# Altium footprint library MyPcbLib.PcbLib: 657 footprints (part 42 of 42)
Each footprint in its own frame and in the unit in brackets; x right, y up, seen from the top. Pads: shape width x height; smd on the part's side, far side on the other; paste and mask are expansions set on the pad; w line width, h text height; cw(c..) or ccw(c..) is an arc to the next point about the centre after c.
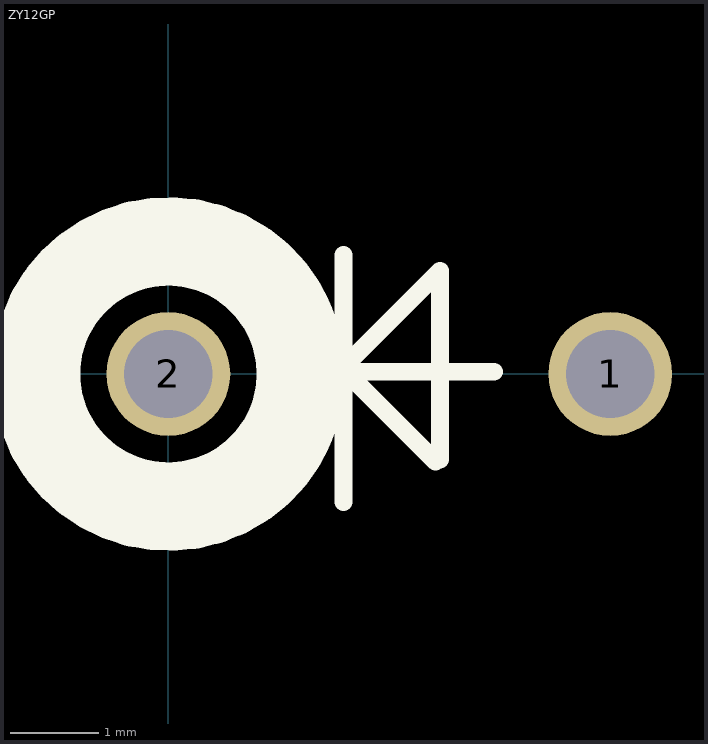
[diagram p41: the footprint, top view; thin cyan lines are the x and y axes]

## ZY12GP [mm]
pads (2):
  round 1.4 hole 1: 1(5,0) 2(0,0)
Top Overlay:
  circle w1: c0,0 r1.5
  lines w0.203: 1.905,0.025 3.683,0.025 ; 1.981,-1.448 1.981,1.346 ; 2.032,0 3.023,-0.991 ; 2.057,0.152 3.073,1.168 3.073,-0.965